# Altium footprint library SMT.PcbLib: 325 footprints (part 4 of 21)
Each footprint in its own frame and in the unit in brackets; x right, y up, seen from the top. Pads: shape width x height; smd on the part's side, far side on the other; paste and mask are expansions set on the pad; w line width, h text height; cw(c..) or ccw(c..) is an arc to the next point about the centre after c.
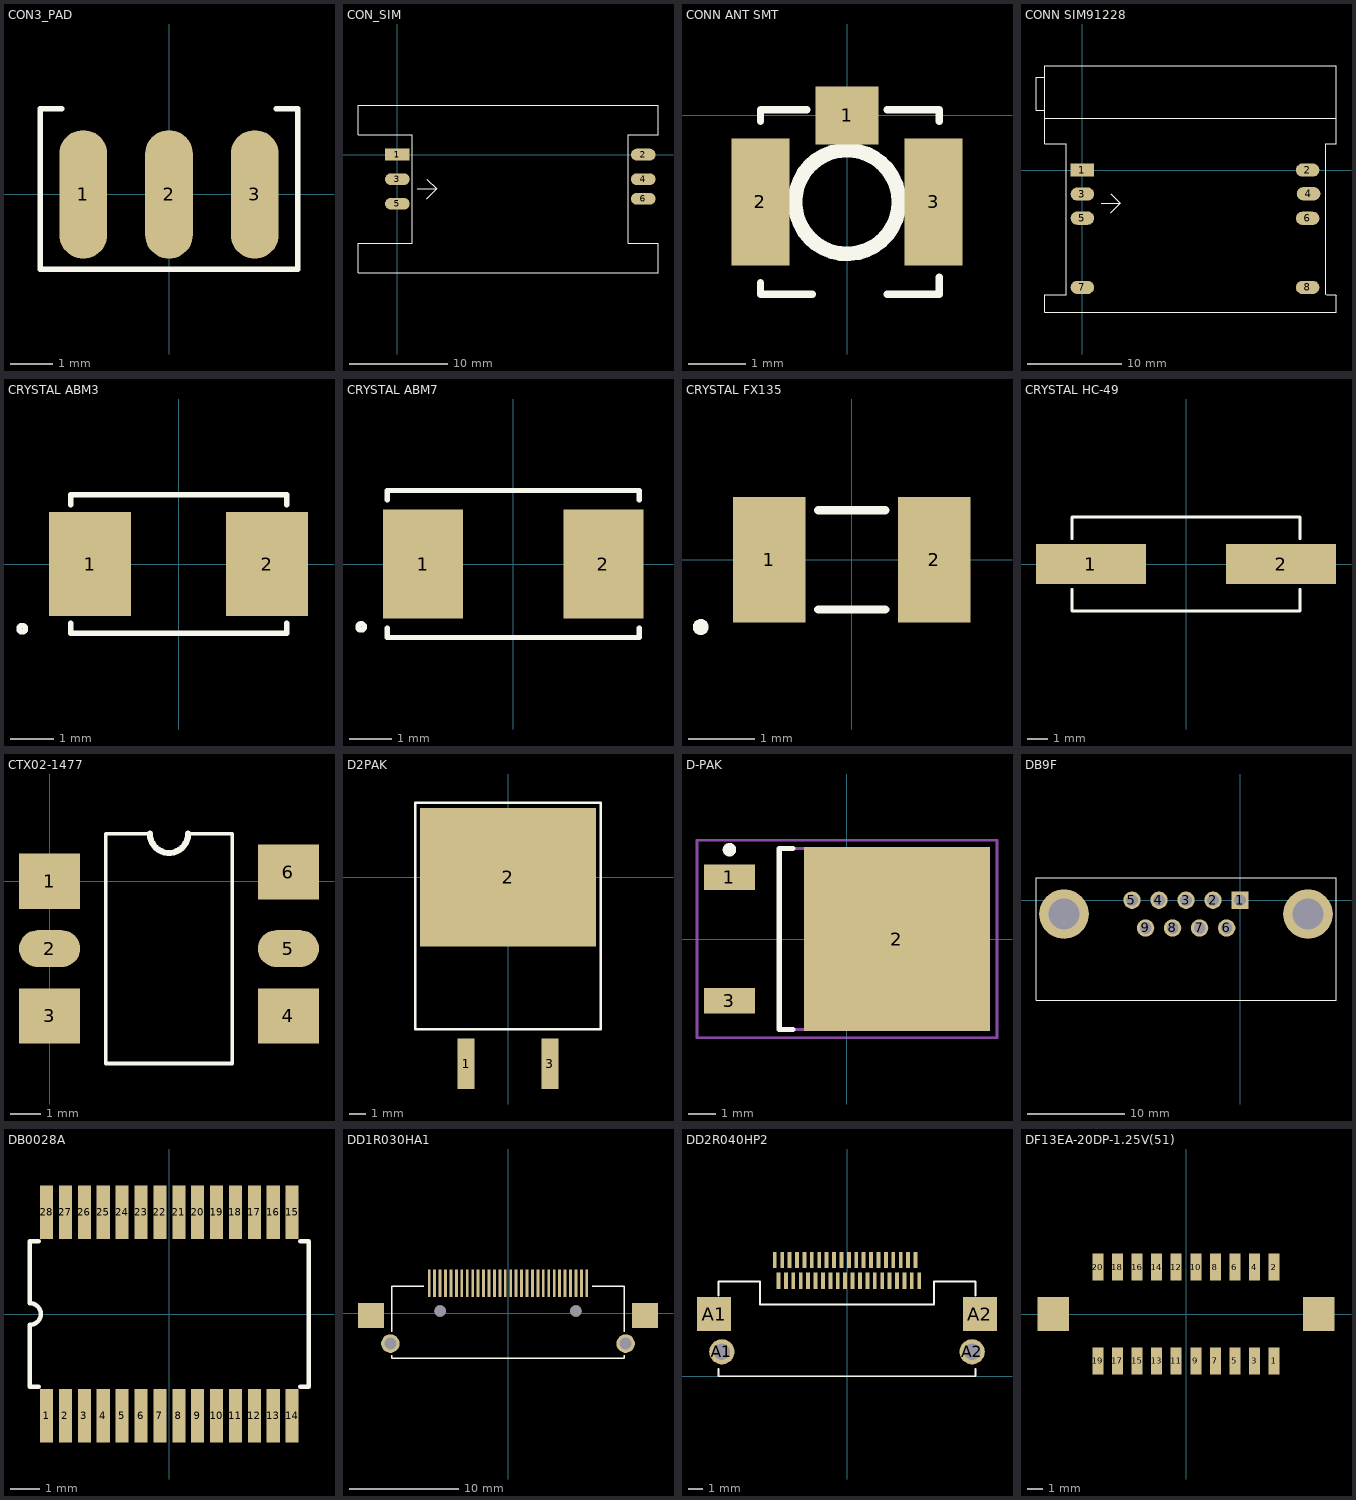
[diagram p3: the footprints below, top view; thin cyan lines are the x and y axes]

## CON3_PAD [mm]
pads (3):
  oval 1.118x3 smd: 1(-2,0) 2(0,0) 3(2,0)
TopOverlay:
  lines w0.127: -2.5,2 -3,2 -3,-1.75 3,-1.75 3,2 2.5,2

## CON_SIM [mm]
pads (6):
  rect 2.5x1.2 smd: 1(0,0)
  oval 2.5x1.2 smd: 2(25,0) 3(0,-2.5) 4(25,-2.5) 5(0,-5) 6(25,-4.5)
TopOverlay:
  lines w0.127: 2,-3.5 4,-3.5 ; 3,-4.5 4,-3.5 ; 3,-2.5 4,-3.5 ; -4,-12 -4,-9 1.5,-9 1.5,2 -4,2 -4,5 26.5,5 26.5,2 23.5,2 23.5,-9 26.5,-9 26.5,-12 -4,-12

## CONN ANT SMT [mm]
pads (3):
  rect 1.1x1 smd: 1(0,0)
  rect 1x2.2 smd: 2(-1.5,-1.5) 3(1.5,-1.5)
TopOverlay:
  circle w0.254: c0,-1.5 r0.9
  lines w0.127: -1.5,-2.9 -1.5,-3.1 -0.6,-3.1 ; -1.5,-0.1 -1.5,0.1 -0.7,0.1 ; 0.7,-3.1 1.6,-3.1 1.6,-2.8 ; 0.7,0.1 1.6,0.1 1.6,-0.1

## CONN SIM91228 [mm]
pads (8):
  rect 2.5x1.4 smd: 1(0,0)
  oval 2.5x1.4 smd: 2(23.8,0) 3(0,-2.54) 4(23.9,-2.5) 5(0,-5.08) 6(23.8,-5.1) 7(0,-12.4) 8(23.8,-12.4)
TopOverlay:
  lines w0.127: -4,6.3 -4.9,6.3 -4.9,9.8 -4,9.8 ; 2,-3.5 4,-3.5 ; 3,-4.5 4,-3.5 ; 3,-2.5 4,-3.5 ; -4,5.5 -4,2.8 -1.7,2.8 -1.7,-13.2 -4,-13.2 -4,-15 26.8,-15 26.8,-13.3 26.7,-13.2 25.8,-13.2 25.7,-13.1 25.7,2.8 26.8,2.8 26.8,5.5 ; -4,5.5 -4,11 26.8,11 26.8,5.5 ; -4,5.5 26.8,5.5

## CRYSTAL ABM3 [mm] "ABM3"
height 1.3
pads (2):
  rect 1.9x2.4 smd: 1(-2.05,0) 2(2.05,0)
TopOverlay:
  circle w0.127: c-3.625,-1.5 r0.075
  lines w0.127: -2.5,-1.375 -2.5,-1.6 2.5,-1.6 2.5,-1.375 ; -2.5,1.375 -2.5,1.6 2.5,1.6 2.5,1.375

## CRYSTAL ABM7 [mm]
height 1.4
pads (2):
  rect 1.9x2.6 smd: 1(-2.15,0) 2(2.15,0)
TopOverlay:
  circle w0.127: c-3.625,-1.5 r0.075
  lines w0.127: -3,-1.525 -3,-1.75 3,-1.75 3,-1.525 ; -3,1.525 -3,1.75 3,1.75 3,1.525

## CRYSTAL FX135 [mm] "FX135"
height 0.9
pads (2):
  rect 1.1x1.9 smd: 1(-1.25,0) 2(1.25,0)
TopOverlay:
  circle w0.127: c-2.286,-1.016 r0.057
  lines w0.127: -0.508,-0.75 0,-0.75 0.508,-0.75 ; -0.508,0.75 0,0.75 0.508,0.75

## CRYSTAL HC-49 [mm] "HC49/SM"
height 4
pads (2):
  rect 5.5x2 smd: 1(-4.75,0) 2(4.75,0)
TopOverlay:
  lines w0.127: -5.7,-1.27 -5.7,-2.35 5.7,-2.35 5.7,-1.27 ; -5.7,1.27 -5.7,2.35 5.7,2.35 5.7,1.27

## CTX02-1477 [mm]
pads (6):
  rect 2x1.8 smd: 1(0,0) 3(0,-4.4) 4(7.8,-4.4) 6(7.8,0.3)
  oval 2x1.2 smd: 2(0,-2.2) 5(7.8,-2.2)
TopOverlay:
  lines w0.127: 3.275,1.55 1.835,1.55 1.835,-5.95 5.965,-5.95 5.965,1.55 4.525,1.55
  lines w0.2: 3.275,1.55 ccw(c3.9,1.55) 4.525,1.55

## D2PAK [mm] "CASE 936-03"
height 4.5
pads (3):
  rect 1.016x3.05 smd: 1(-2.54,-11.305) 3(2.54,-11.305)
  rect 10.66x8.38 smd: 2(0,0)
TopOverlay:
  lines w0.152: -5.625,-9.2 -5.625,4.5 5.625,4.5 5.625,-9.2 -5.625,-9.2

## D-PAK [mm] "D-PAK, 3-Pads, Body 6.2x6.7mm (max), IPC Medium Density"
height 2.38
pads (3):
  rect 1.9x0.95 smd: 1(-4.35,2.28) 3(-4.35,-2.28)
  rect 6.9x6.8 smd: 2(1.85,0)
TopOverlay:
  circle w0.25: c-4.35,3.305 r0.125
  lines w0.2: -2,-3.35 -2.5,-3.35 -2.5,3.35 -2,3.35
Mechanical13:
  lines w0.1: -2.5,-3.35 -2.5,3.35 3.7,3.35 3.7,-3.35 -2.5,-3.35
Mechanical15:
  lines w0.1: -0.5,0 0.5,0 ; 0,-0.5 0,0.5 ; -5.55,-3.65 -5.55,3.65 5.55,3.65 5.55,-3.65 -5.55,-3.65
3D body: height 2.38, standoff 0, extent -2.5,-3.35 3.7,3.35

## DB9F [mil]
pads (11):
  rect 70x70 hole 47: 1(0,0)
  round 70 hole 47: 2(-109,0) 3(-218,0) 4(-327,0) 5(-436,0) 6(-54,-112) 7(-163,-112) 8(-272,-112) 9(-381,-112)
  round 200 hole 125: ""(-710,-56) ""(274,-56)
TopOverlay:
  lines w5: -823,-403 387,-403 387,90 -823,90 -823,-403

## DB0028A [mm]
pads (28):
  rect 0.45x1.85 smd: 1(-4.225,-3.5) 2(-3.575,-3.5) 3(-2.925,-3.5) 4(-2.275,-3.5) 5(-1.625,-3.5) 6(-0.975,-3.5) 7(-0.325,-3.5) 8(0.325,-3.5) 9(0.975,-3.5) 10(1.625,-3.5) 11(2.275,-3.5) 12(2.925,-3.5) 13(3.575,-3.5) 14(4.225,-3.5) 15(4.225,3.5) 16(3.575,3.5) 17(2.925,3.5) 18(2.275,3.5) 19(1.625,3.5) 20(0.975,3.5) 21(0.325,3.5) 22(-0.325,3.5) 23(-0.975,3.5) 24(-1.625,3.5) 25(-2.275,3.5) 26(-2.925,3.5) 27(-3.575,3.5) 28(-4.225,3.5)
TopOverlay:
  lines w0.152: -4.8,2.5 -4.8,0.375 cw(c-4.8,0) -4.8,-0.375 -4.8,-2.5 -4.5,-2.5 ; -4.8,2.5 -4.5,2.5 ; 4.5,-2.5 4.8,-2.5 4.8,0 4.8,2.5 4.5,2.5
3D body: height 0.2, standoff 0, extent -3.7,2.921 -3.45,3.277
3D body: height 0.4, standoff 0, extent -3.7,2.769 -3.45,2.921
3D body: height 0.4, standoff 0.2, extent -3.7,2.489 -3.45,2.769
3D body: height 0.2, standoff 0, extent -1.1,2.921 -0.85,3.277
3D body: height 0.4, standoff 0, extent -1.1,2.769 -0.85,2.921
3D body: height 0.4, standoff 0.2, extent -1.1,2.489 -0.85,2.769
3D body: height 0.2, standoff 0, extent -1.75,2.921 -1.5,3.277
3D body: height 0.4, standoff 0, extent -1.75,2.769 -1.5,2.921
3D body: height 0.4, standoff 0.2, extent -1.75,2.489 -1.5,2.769
3D body: height 0.2, standoff 0, extent -2.4,2.921 -2.15,3.277
3D body: height 0.4, standoff 0, extent -2.4,2.769 -2.15,2.921
3D body: height 0.4, standoff 0.2, extent -2.4,2.489 -2.15,2.769
3D body: height 0.2, standoff 0, extent -3.05,2.921 -2.8,3.277
3D body: height 0.4, standoff 0, extent -3.05,2.769 -2.8,2.921
3D body: height 0.4, standoff 0.2, extent -3.05,2.489 -2.8,2.769
3D body: height 0.2, standoff 0, extent 1.5,2.921 1.75,3.277
3D body: height 0.4, standoff 0, extent 1.5,2.769 1.75,2.921
3D body: height 0.4, standoff 0.2, extent 1.5,2.489 1.75,2.769
3D body: height 0.2, standoff 0, extent 0.85,2.921 1.1,3.277
3D body: height 0.4, standoff 0, extent 0.85,2.769 1.1,2.921
3D body: height 0.4, standoff 0.2, extent 0.85,2.489 1.1,2.769
3D body: height 0.2, standoff 0, extent 0.2,2.921 0.45,3.277
3D body: height 0.4, standoff 0, extent 0.2,2.769 0.45,2.921
3D body: height 0.4, standoff 0.2, extent 0.2,2.489 0.45,2.769
3D body: height 0.2, standoff 0, extent -0.45,2.921 -0.2,3.277
3D body: height 0.4, standoff 0, extent -0.45,2.769 -0.2,2.921
3D body: height 0.4, standoff 0.2, extent -0.45,2.489 -0.2,2.769
3D body: height 0.2, standoff 0, extent 4.1,2.921 4.35,3.277
3D body: height 0.4, standoff 0, extent 4.1,2.769 4.35,2.921
3D body: height 0.4, standoff 0.2, extent 4.1,2.489 4.35,2.769
3D body: height 0.2, standoff 0, extent 3.45,2.921 3.7,3.277
3D body: height 0.4, standoff 0, extent 3.45,2.769 3.7,2.921
3D body: height 0.4, standoff 0.2, extent 3.45,2.489 3.7,2.769
3D body: height 0.2, standoff 0, extent 2.8,2.921 3.05,3.277
3D body: height 0.4, standoff 0, extent 2.8,2.769 3.05,2.921
3D body: height 0.4, standoff 0.2, extent 2.8,2.489 3.05,2.769
3D body: height 0.2, standoff 0, extent 2.15,2.921 2.4,3.277
3D body: height 0.4, standoff 0, extent 2.15,2.769 2.4,2.921
3D body: height 0.4, standoff 0.2, extent 2.15,2.489 2.4,2.769
3D body: height 0.2, standoff 0, extent 3.45,-3.278 3.7,-2.922
3D body: height 0.4, standoff 0, extent 3.45,-2.922 3.7,-2.77
3D body: height 0.4, standoff 0.2, extent 3.45,-2.77 3.7,-2.49
3D body: height 0.2, standoff 0, extent 4.1,-3.278 4.35,-2.922
3D body: height 0.4, standoff 0, extent 4.1,-2.922 4.35,-2.77
3D body: height 0.4, standoff 0.2, extent 4.1,-2.77 4.35,-2.49
3D body: height 0.2, standoff 0, extent 0.85,-3.278 1.1,-2.922
3D body: height 0.4, standoff 0, extent 0.85,-2.922 1.1,-2.77
3D body: height 0.4, standoff 0.2, extent 0.85,-2.77 1.1,-2.49
3D body: height 0.2, standoff 0, extent 1.5,-3.278 1.75,-2.922
3D body: height 0.4, standoff 0, extent 1.5,-2.922 1.75,-2.77
3D body: height 0.4, standoff 0.2, extent 1.5,-2.77 1.75,-2.49
3D body: height 0.2, standoff 0, extent 2.15,-3.278 2.4,-2.922
3D body: height 0.4, standoff 0, extent 2.15,-2.922 2.4,-2.77
3D body: height 0.4, standoff 0.2, extent 2.15,-2.77 2.4,-2.49
3D body: height 0.2, standoff 0, extent 2.8,-3.278 3.05,-2.922
3D body: height 0.4, standoff 0, extent 2.8,-2.922 3.05,-2.77
3D body: height 0.4, standoff 0.2, extent 2.8,-2.77 3.05,-2.49
3D body: height 0.2, standoff 0, extent -1.75,-3.278 -1.5,-2.922
3D body: height 0.4, standoff 0, extent -1.75,-2.922 -1.5,-2.77
3D body: height 0.4, standoff 0.2, extent -1.75,-2.77 -1.5,-2.49
3D body: height 0.2, standoff 0, extent -1.1,-3.278 -0.85,-2.922
3D body: height 0.4, standoff 0, extent -1.1,-2.922 -0.85,-2.77
3D body: height 0.4, standoff 0.2, extent -1.1,-2.77 -0.85,-2.49
3D body: height 0.2, standoff 0, extent -0.45,-3.278 -0.2,-2.922
3D body: height 0.4, standoff 0, extent -0.45,-2.922 -0.2,-2.77
3D body: height 0.4, standoff 0.2, extent -0.45,-2.77 -0.2,-2.49
3D body: height 0.2, standoff 0, extent 0.2,-3.278 0.45,-2.922
3D body: height 0.4, standoff 0, extent 0.2,-2.922 0.45,-2.77
3D body: height 0.4, standoff 0.2, extent 0.2,-2.77 0.45,-2.49
3D body: height 0.4, standoff 0.2, extent -2.4,-2.77 -2.15,-2.49
3D body: height 0.4, standoff 0, extent -2.4,-2.922 -2.15,-2.77
3D body: height 0.2, standoff 0, extent -2.4,-3.278 -2.15,-2.922
3D body: height 0.4, standoff 0.2, extent -3.05,-2.77 -2.8,-2.49
3D body: height 0.4, standoff 0, extent -3.05,-2.922 -2.8,-2.77
3D body: height 0.2, standoff 0, extent -3.05,-3.278 -2.8,-2.922
3D body: height 0.4, standoff 0.2, extent -3.7,-2.77 -3.45,-2.49
3D body: height 0.4, standoff 0, extent -3.7,-2.922 -3.45,-2.77
3D body: height 0.2, standoff 0, extent -3.7,-3.278 -3.45,-2.922
3D body: height 1.2, standoff 0, extent -4.75,-2.5 4.75,2.5
3D body: height 0.2, standoff 0, extent -4.35,-3.277 -4.1,-2.921
3D body: height 0.4, standoff 0, extent -4.35,-2.921 -4.1,-2.769
3D body: height 0.4, standoff 0.2, extent -4.35,-2.769 -4.1,-2.489
3D body: height 0.4, standoff 0.2, extent -4.35,2.489 -4.1,2.769
3D body: height 0.4, standoff 0, extent -4.35,2.769 -4.1,2.921
3D body: height 0.2, standoff 0, extent -4.35,2.921 -4.1,3.277

## DD1R030HA1 [mm] "JAE-DD1R030HA1"
height 3.8
pads (36):
  rect 0.26x2.5 smd: 1(-7.25,2.775) 2(-6.75,2.775) 3(-6.25,2.775) 4(-5.75,2.775) 5(-5.25,2.775) 6(-4.75,2.775) 7(-4.25,2.775) 8(-3.75,2.775) 9(-3.25,2.775) 10(-2.75,2.775) 11(-2.25,2.775) 12(-1.75,2.775) 13(-1.25,2.775) 14(-0.75,2.775) 15(-0.25,2.775) 16(0.25,2.775) 17(0.75,2.775) 18(1.25,2.775) 19(1.75,2.775) 20(2.25,2.775) 21(2.75,2.775) 22(3.25,2.775) 23(3.75,2.775) 24(4.25,2.775) 25(4.75,2.775) 26(5.25,2.775) 27(5.75,2.775) 28(6.25,2.775) 29(6.75,2.775) 30(7.25,2.775)
  rect 2.4x2.3 smd: ""(-12.6,-0.2) ""(12.6,-0.2)
  round 1.7 hole 1.1: ""(-10.825,-2.775) ""(10.825,-2.775)
  round 1.05 hole 1.05 unplated: ""(-6.25,0.225) ""(6.25,0.225)
TopOverlay:
  lines w0.127: -10.7,-3.829 -10.7,-4.125 10.7,-4.125 10.7,-3.829 ; -10.7,-1.67 -10.7,2.525 -7.774,2.525 ; 7.774,2.525 10.7,2.525 10.7,-1.67
3D body "K3D-DD1R030HA1-R2 JAE Connector Division Proprietary.STEP": height 3.45, standoff -1, extent -12.101,-4.937 12.098,2.213

## DD2R040HP2 [mm] "MB-0112-3"
height 4.25
pads (44):
  rect 0.26x1.1 smd: 1(-4.875,7.85) 2(-4.375,7.85) 3(-3.875,7.85) 4(-3.375,7.85) 5(-2.875,7.85) 6(-2.375,7.85) 7(-1.875,7.85) 8(-1.375,7.85) 9(-0.875,7.85) 10(-0.375,7.85) 11(0.125,7.85) 12(0.625,7.85) 13(1.125,7.85) 14(1.625,7.85) 15(2.125,7.85) 16(2.625,7.85) 17(3.125,7.85) 18(3.625,7.85) 19(4.125,7.85) 20(4.625,7.85) 21(-4.625,6.452) 22(-4.125,6.452) 23(-3.625,6.452) 24(-3.125,6.452) 25(-2.625,6.452) 26(-2.125,6.452) 27(-1.625,6.452) 28(-1.125,6.452) 29(-0.625,6.452) 30(-0.125,6.452) 31(0.375,6.452) 32(0.875,6.452) 33(1.375,6.452) 34(1.875,6.452) 35(2.375,6.452) 36(2.875,6.452) 37(3.375,6.452) 38(3.875,6.452) 39(4.375,6.452) 40(4.875,6.452)
  rect 2.3x2.3 smd: A1(-8.975,4.2) A2(8.975,4.2)
  round 1.7 hole 1.1: A1(-8.45,1.65) A2(8.45,1.65)
TopOverlay:
  lines w0.127: -8.675,0.508 -8.675,0 0,0 8.675,0 8.675,0.508 ; -8.675,5.461 -8.675,6.4 ; -8.674,6.401 -5.875,6.401 -5.875,4.85 0,4.85 5.875,4.85 5.875,6.401 8.674,6.401 ; 8.675,5.461 8.675,6.4
3D body "K3D-DD2R040HP2-R2 JAE Connector Division Proprietary.STEP": height 4.2, standoff -0.95, extent -9.725,-0.483 9.725,8.117

## DF13EA-20DP-1.25V(51) [mm] "Header"
height 4.8
pads (22):
  rect 0.7x1.7 smd: 1(5.625,-3) 2(5.625,3) 3(4.375,-3) 4(4.375,3) 5(3.125,-3) 6(3.125,3) 7(1.875,-3) 8(1.875,3) 9(0.625,-3) 10(0.625,3) 11(-0.625,-3) 12(-0.625,3) 13(-1.875,-3) 14(-1.875,3) 15(-3.125,-3) 16(-3.125,3) 17(-4.375,-3) 18(-4.375,3) 19(-5.625,-3) 20(-5.625,3)
  rect 2x2.2 smd: ""(-8.475,0) ""(8.475,0)